# Altium footprint library EPCOS.PcbLib: 178 footprints (part 10 of 12)
Each footprint in its own frame and in the unit in brackets; x right, y up, seen from the top. Pads: shape width x height; smd on the part's side, far side on the other; paste and mask are expansions set on the pad; w line width, h text height; cw(c..) or ccw(c..) is an arc to the next point about the centre after c.
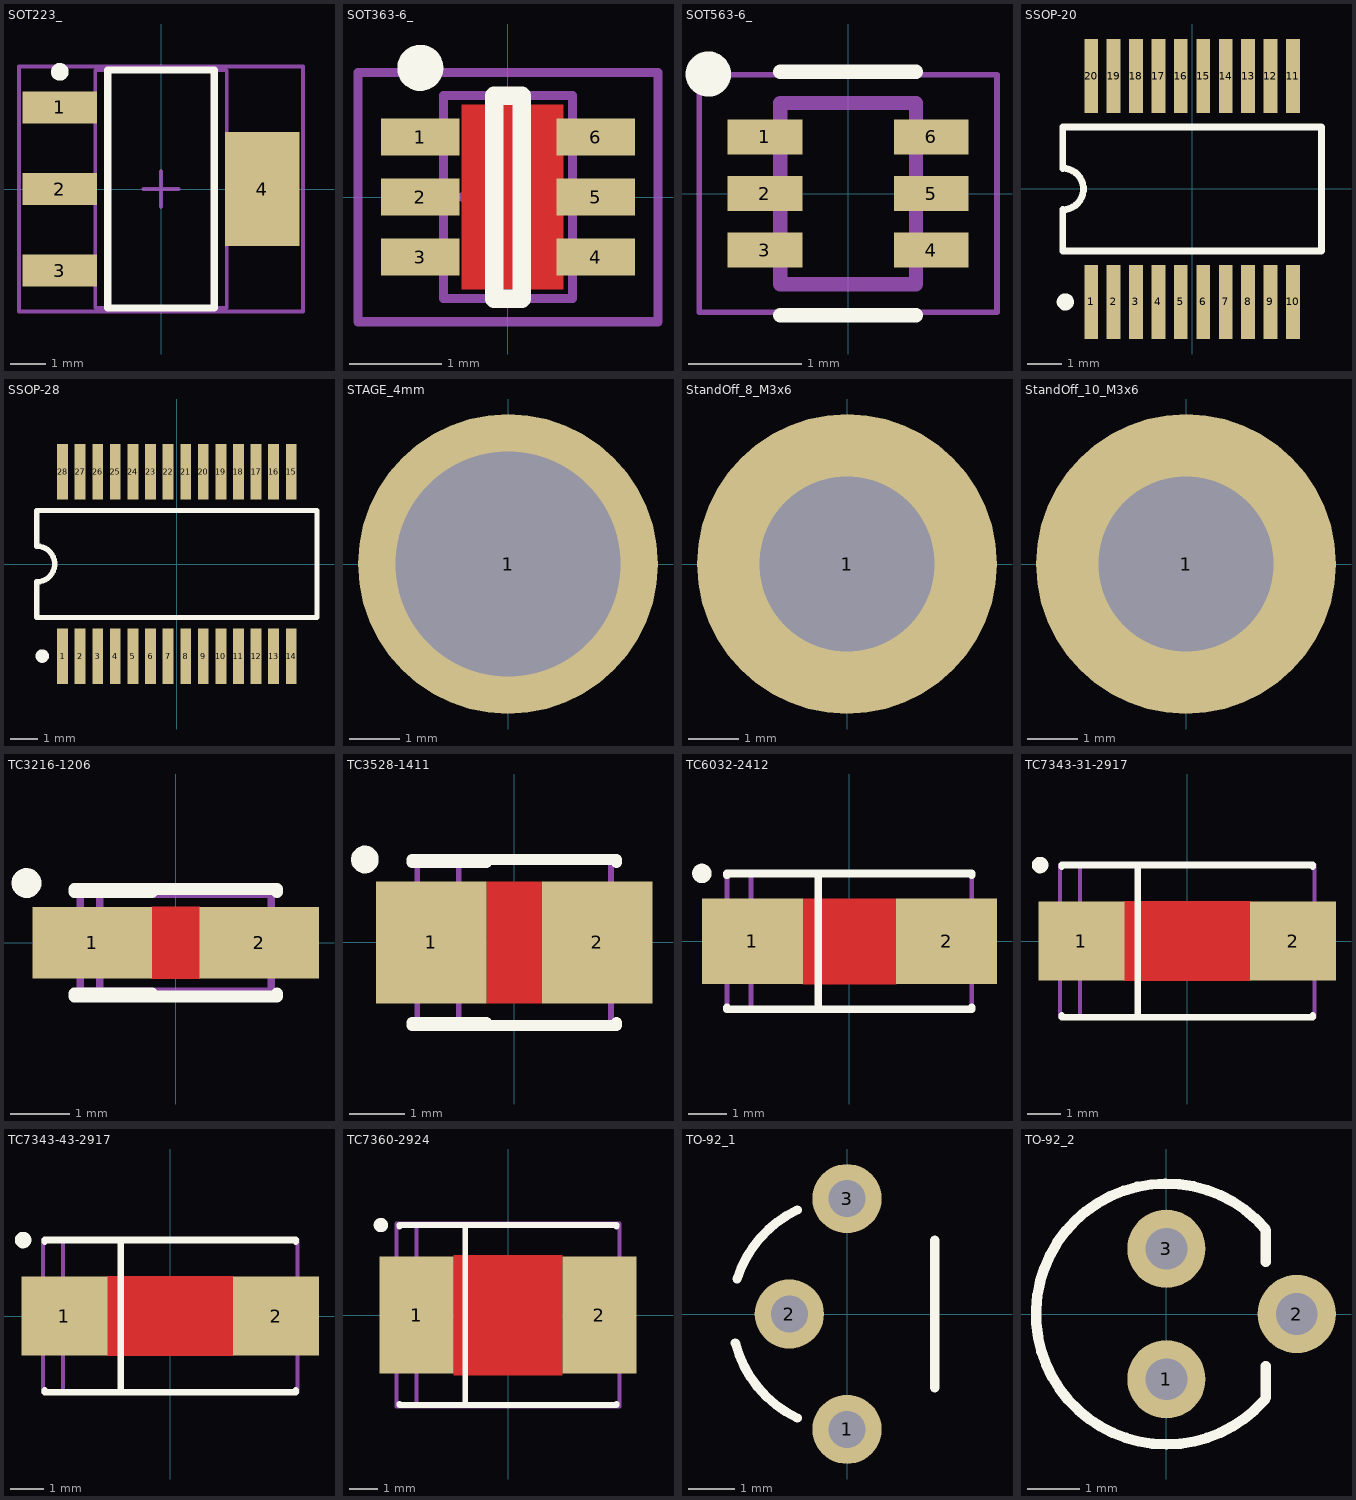
[diagram p9: the footprints below, top view; thin cyan lines are the x and y axes]

## SOT223_ [mm]
height 1.8
pads (4):
  rect 2.1x0.9 smd: 1(-2.85,2.3) 2(-2.85,0) 3(-2.85,-2.3)
  rect 2.1x3.2 smd: 4(2.85,0)
Top Overlay:
  circle w0.25: c-2.85,3.3 r0.125
  lines w0.2: -1.5,-3.35 -1.5,3.35 1.5,3.35 1.5,-3.35 -1.5,-3.35
Mechanical 13:
  lines w0.1: -1.85,-3.35 -1.85,3.35 1.85,3.35 1.85,-3.35 -1.85,-3.35
Mechanical 15:
  lines w0.1: -0.5,0 0.5,0 ; 0,-0.5 0,0.5 ; -4,-3.45 -4,3.45 4,3.45 4,-3.45 -4,-3.45
3D body "SOT223.stp": height 1.59, standoff -0.01, extent -3.497,-3.333 3.503,3.167

## SOT363-6_ [mm]
height 1
pads (6):
  rect 0.85x0.4 smd: 1(-0.95,0.65) 2(-0.95,0) 3(-0.95,-0.65) 4(0.95,-0.65) 5(0.95,0) 6(0.95,0.65)
Top Layer:
  pour cut-out: -0.5,1 0.6,1 0.6,-1 -0.5,-1
Top Overlay:
  circle w0.25: c-0.95,1.4 r0.125
  lines w0.2: -0.15,-1.1 0.15,-1.1 0.15,1.1 -0.15,1.1 -0.15,-1.1
Mechanical 13:
  lines w0.1: -0.7,-1.1 -0.7,1.1 0.7,1.1 0.7,-1.1 -0.7,-1.1
Mechanical 15:
  lines w0.1: -0.5,0 0.5,0 ; 0,-0.5 0,0.5 ; -1.625,-1.35 -1.625,1.35 1.625,1.35 1.625,-1.35 -1.625,-1.35
3D body "User Library-SOT363-2.step": height 1.1, standoff 0, extent -1.2,-1.1 1.2,1.1

## SOT563-6_ [mm]
height 0.6
pads (6):
  rect 0.66x0.31 smd: 1(-0.735,0.5) 2(-0.735,0) 3(-0.735,-0.5) 4(0.735,-0.5) 5(0.735,0) 6(0.735,0.5)
Top Overlay:
  circle w0.2: c-1.235,1.055 r0.1
  lines w0.127: -0.6,-1.075 0.6,-1.075 ; -0.6,1.075 0.6,1.075
Mechanical 13:
  lines w0.127: -0.6,-0.8 -0.6,0.8 0.6,0.8 0.6,-0.8 -0.6,-0.8
Mechanical 15:
  lines w0.05: -1.315,-1.05 1.315,-1.05 1.315,1.05 -1.315,1.05 -1.315,-1.05
3D body "User Library-SOT-563_TI.STEP": height 0.59, standoff 0, extent -0.813,-0.8 0.813,0.8

## SSOP-20 [mm] "SSOP, Plastic; 20 Leads; Body Width 5.3 mm; Pitch 0.65 mm"
height 2
pads (20):
  rect 0.4x2.15 smd: 1(-2.925,-3.275) 2(-2.275,-3.275) 3(-1.625,-3.275) 4(-0.975,-3.275) 5(-0.325,-3.275) 6(0.325,-3.275) 7(0.975,-3.275) 8(1.625,-3.275) 9(2.275,-3.275) 10(2.925,-3.275) 11(2.925,3.275) 12(2.275,3.275) 13(1.625,3.275) 14(0.975,3.275) 15(0.325,3.275) 16(-0.325,3.275) 17(-0.975,3.275) 18(-1.625,3.275) 19(-2.275,3.275) 20(-2.925,3.275)
Top Overlay:
  circle w0.25: c-3.675,-3.275 r0.125
  lines w0.2: -3.75,-1.8 -3.75,-0.6 ccw(c-3.75,0) -3.75,0.6 -3.75,1.8 3.75,1.8 3.75,-1.8 -3.75,-1.8
3D body "User Library-SSOP_20.step": height 1.79, standoff -0.05, extent -3.675,-3.95 3.625,3.95

## SSOP-28 [mm] "SSOP, Plastic; 28 Leads; Body Width 5.2 mm; Pitch 0.65 mm"
height 2
pads (28):
  rect 0.4x2.05 smd: 1(-4.225,-3.4) 2(-3.575,-3.4) 3(-2.925,-3.4) 4(-2.275,-3.4) 5(-1.625,-3.4) 6(-0.975,-3.4) 7(-0.325,-3.4) 8(0.325,-3.4) 9(0.975,-3.4) 10(1.625,-3.4) 11(2.275,-3.4) 12(2.925,-3.4) 13(3.575,-3.4) 14(4.225,-3.4) 15(4.225,3.4) 16(3.575,3.4) 17(2.925,3.4) 18(2.275,3.4) 19(1.625,3.4) 20(0.975,3.4) 21(0.325,3.4) 22(-0.325,3.4) 23(-0.975,3.4) 24(-1.625,3.4) 25(-2.275,3.4) 26(-2.925,3.4) 27(-3.575,3.4) 28(-4.225,3.4)
Top Overlay:
  circle w0.25: c-4.975,-3.4 r0.125
  lines w0.2: -5.175,-1.975 5.175,-1.975 5.175,1.975 -5.175,1.975 -5.175,0.658 cw(c-5.175,0) -5.175,-0.658 -5.175,-1.975
3D body "User Library-SSOP-28-4.step": height 2.15, standoff 0, extent -5.165,-3.878 5.165,3.878

## STAGE_4mm [mm]
pads (1):
  round 6 hole 4.5: 1(0,0)

## StandOff_8_M3x6 [mm]
height 8
pads (1):
  round 6 hole 3.5 unplated: 1(0,0)
3D body "User Library-Male - Female Hexagonal Threaded Standoffs; length 8mm; key 5mm; M3x5mm and M3x6mm.step": height 8, standoff -6, extent -2.887,-2.5 2.887,2.5

## StandOff_10_M3x6 [mm]
height 10
pads (1):
  round 6 hole 3.5 unplated: 1(0,0)
3D body "User Library-Male - Female Hexagonal Threaded Standoffs; length 10mm; key 5mm; M3x6mm and M3x6mm.step": height 10, standoff -6, extent -2.887,-2.5 2.887,2.5

## TC3216-1206 [mm]
height 1.5
pads (2):
  rect 2x1.2 smd: 1(-1.4,0) 2(1.4,0)
Top Layer:
  pour cut-out: -0.4,0.6 0.4,0.6 0.4,-0.6 -0.4,-0.6
Top Overlay:
  circle w0.25: c-2.5,1 r0.125
  lines w0.2: -1.7,-0.9 1.7,-0.9 1.7,-0.85 ; -1.7,-0.85 -0.4,-0.85 ; -1.7,0.85 -0.4,0.85 ; -1.7,0.9 1.7,0.9 1.7,0.85
Mechanical 13:
  lines w0.102: -1.6,-0.508 -1.778,-0.508 -1.778,0.508 -1.6,0.508 ; 1.6,-0.508 1.778,-0.508 1.778,0.508 1.6,0.508
  lines w0.127: -1.27,-0.813 -1.27,0.813 ; -1.6,-0.813 -1.6,0.813 1.6,0.813 1.6,-0.813 -1.6,-0.813
3D body "User Library-AVX_ACASE.step": height 1.71, standoff 0, extent -1.7,-0.84 1.7,0.84

## TC3528-1411 [mm] "Capacitor, SM Tantalum; Body 3.5 x 2.8 mm (LxW typ)"
height 2.5
pads (2):
  rect 2x2.2 smd: 1(-1.5,0) 2(1.5,0)
Top Layer:
  pour cut-out: -0.5,1.1 0.5,1.1 0.5,-1.1 -0.5,-1.1
Top Overlay:
  circle w0.25: c-2.7,1.5 r0.125
  lines w0.2: -1.85,-1.5 1.85,-1.5 1.85,-1.45 ; -1.85,-1.45 -0.5,-1.45 ; -1.85,1.45 -0.5,1.45 ; -1.85,1.5 1.85,1.5 1.85,1.45
Mechanical 13:
  lines w0.1: -1.75,-1 -2,-1 -2,1 -1.75,1 ; -1,-1.5 -1,1.5 ; 1.75,-1 2,-1 2,1 1.75,1 ; -1.75,-1.5 -1.75,1.5 1.75,1.5 1.75,-1.5 -1.75,-1.5
3D body "User Library-AVX_BCASE.step": height 2.03, standoff 0, extent -1.85,-1.465 1.85,1.465

## TC6032-2412 [mm] "Capacitor, SM Tantalum; Body 6.0 x 3.2 mm (LxW typ)"
height 3.4
pads (2):
  rect 2.6x2.2 smd: 1(-2.5,0) 2(2.5,0)
Top Layer:
  pour cut-out: -1.2,1.1 1.2,1.1 1.2,-1.1 -1.2,-1.1
Top Overlay:
  circle w0.25: c-3.8,1.75 r0.125
  lines w0.2: -3.15,-1.7 -3.15,-1.75 3.15,-1.75 3.15,-1.7 ; -3.15,1.7 -3.15,1.75 3.15,1.75 3.15,1.7 ; -0.8,-1.75 -0.8,1.75
Mechanical 13:
  lines w0.127: -3.15,-1.016 -3.429,-1.016 -3.429,1.016 -3.15,1.016 ; -2.54,-1.753 -2.54,1.753 ; 3.15,-1.016 3.429,-1.016 3.429,1.016 3.15,1.016 ; -3.15,-1.753 -3.15,1.753 3.15,1.753 3.15,-1.753 -3.15,-1.753
3D body "User Library-AVX_C_CASE.step": height 2.7, standoff 0, extent -3.05,-1.675 3.05,1.675

## TC7343-31-2917 [mm] "Capacitor, SM Tantalum; Body 7.3 x 4.3 mm (LxW typ)"
height 3.7
pads (2):
  rect 2.6x2.4 smd: 1(-3.2,0) 2(3.2,0)
Top Layer:
  pour cut-out: -1.9,1.2 1.9,1.2 1.9,-1.2 -1.9,-1.2
Top Overlay:
  circle w0.25: c-4.45,2.3 r0.125
  lines w0.2: -3.8,-2.25 -3.8,-2.3 3.8,-2.3 3.8,-2.25 ; -3.8,2.25 -3.8,2.3 3.8,2.3 3.8,2.25 ; -1.5,-2.3 -1.5,2.3
Mechanical 13:
  lines w0.127: -3.85,-1.016 -4.129,-1.016 -4.129,1.016 -3.85,1.016 ; -3.24,-2.3 -3.24,2.3 ; 3.85,-1.016 4.129,-1.016 4.129,1.016 3.85,1.016 ; -3.85,-2.3 3.85,-2.3 3.85,2.3 -3.85,2.3 -3.85,-2.3
3D body "User Library-AVX_D_CASE.step": height 3.01, standoff 0, extent -3.7,-2.225 3.7,2.225

## TC7343-43-2917 [mm] "Capacitor, SM Tantalum; Body 7.3 x 4.3 mm (LxW typ)"
height 4.5
pads (2):
  rect 2.6x2.4 smd: 1(-3.2,0) 2(3.2,0)
Top Layer:
  pour cut-out: -1.9,1.2 1.9,1.2 1.9,-1.2 -1.9,-1.2
Top Overlay:
  circle w0.25: c-4.45,2.3 r0.125
  lines w0.2: -3.8,-2.25 -3.8,-2.3 3.8,-2.3 3.8,-2.25 ; -3.8,2.25 -3.8,2.3 3.8,2.3 3.8,2.25 ; -1.5,-2.3 -1.5,2.3
Mechanical 13:
  lines w0.127: -3.85,-1.016 -4.129,-1.016 -4.129,1.016 -3.85,1.016 ; -3.24,-2.3 -3.24,2.3 ; 3.85,-1.016 4.129,-1.016 4.129,1.016 3.85,1.016 ; -3.85,-2.3 -3.85,2.3 3.85,2.3 3.85,-2.3 -3.85,-2.3
3D body "User Library-AVX_E_CASE.step": height 4.2, standoff 0, extent -3.7,-2.225 3.7,2.225

## TC7360-2924 [mm] "Capacitor, SM Tantalum; Body 7.3 x 6.0 mm (LxW typ)"
height 3.8
pads (2):
  rect 2.6x4.1 smd: 1(-3.2,0) 2(3.2,0)
Top Layer:
  pour cut-out: -1.9,2.1 1.9,2.1 1.9,-2.1 -1.9,-2.1
Top Overlay:
  circle w0.25: c-4.45,3.15 r0.125
  lines w0.2: -3.8,-3.1 -3.8,-3.15 3.8,-3.15 3.8,-3.1 ; -3.8,3.1 -3.8,3.15 3.8,3.15 3.8,3.1 ; -1.5,-3.15 -1.5,3.15
Mechanical 15:
  lines w0.15: -3.2,-3.2 -3.2,3.2 ; -1.5,-3.2 -1.5,3.2 -3.9,3.2 ; -3.9,3.2 3.9,3.2 3.9,-3.2 -3.9,-3.2 -3.9,3.2
  lines w0.254: -1,0 1,0 ; 0,-1 0,1
3D body "TC7361-38 Case V.STEP": height 3.45, standoff 0, extent -3.65,-3.05 3.65,3.05

## TO-92_1 [mm]
height 7.5
pads (3):
  round 1.5 hole 0.8: 1(0,-2.5) 2(-1.25,0) 3(0,2.5)
Top Overlay:
  lines w0.2: -2.419,-0.631 ccw(c0,0) -1.079,-2.255 ; -2.381,0.762 cw(c0,0) -1.079,2.255 ; 1.9,-1.6 1.9,1.6
3D body "ALSRobot-TO-92B.step": height 7.34, standoff -0.7, extent -2.35,-2.84 1.45,2.84

## TO-92_2 [mm]
height 7.62
pads (3):
  round 1.5 hole 0.8: 1(0,-1.25) 2(2.5,0) 3(0,1.25)
Top Overlay:
  lines w0.2: 1.881,-1.646 cw(c0,0) -2.185,-1.214 cw(c0,0) 1.898,1.627 ; 1.9,-1.6 1.9,-1 ; 1.9,1 1.9,1.6